# Altium footprint library Connector.PcbLib: 536 footprints (part 2 of 34)
Each footprint in its own frame and in the unit in brackets; x right, y up, seen from the top. Pads: shape width x height; smd on the part's side, far side on the other; paste and mask are expansions set on the pad; w line width, h text height; cw(c..) or ccw(c..) is an arc to the next point about the centre after c.
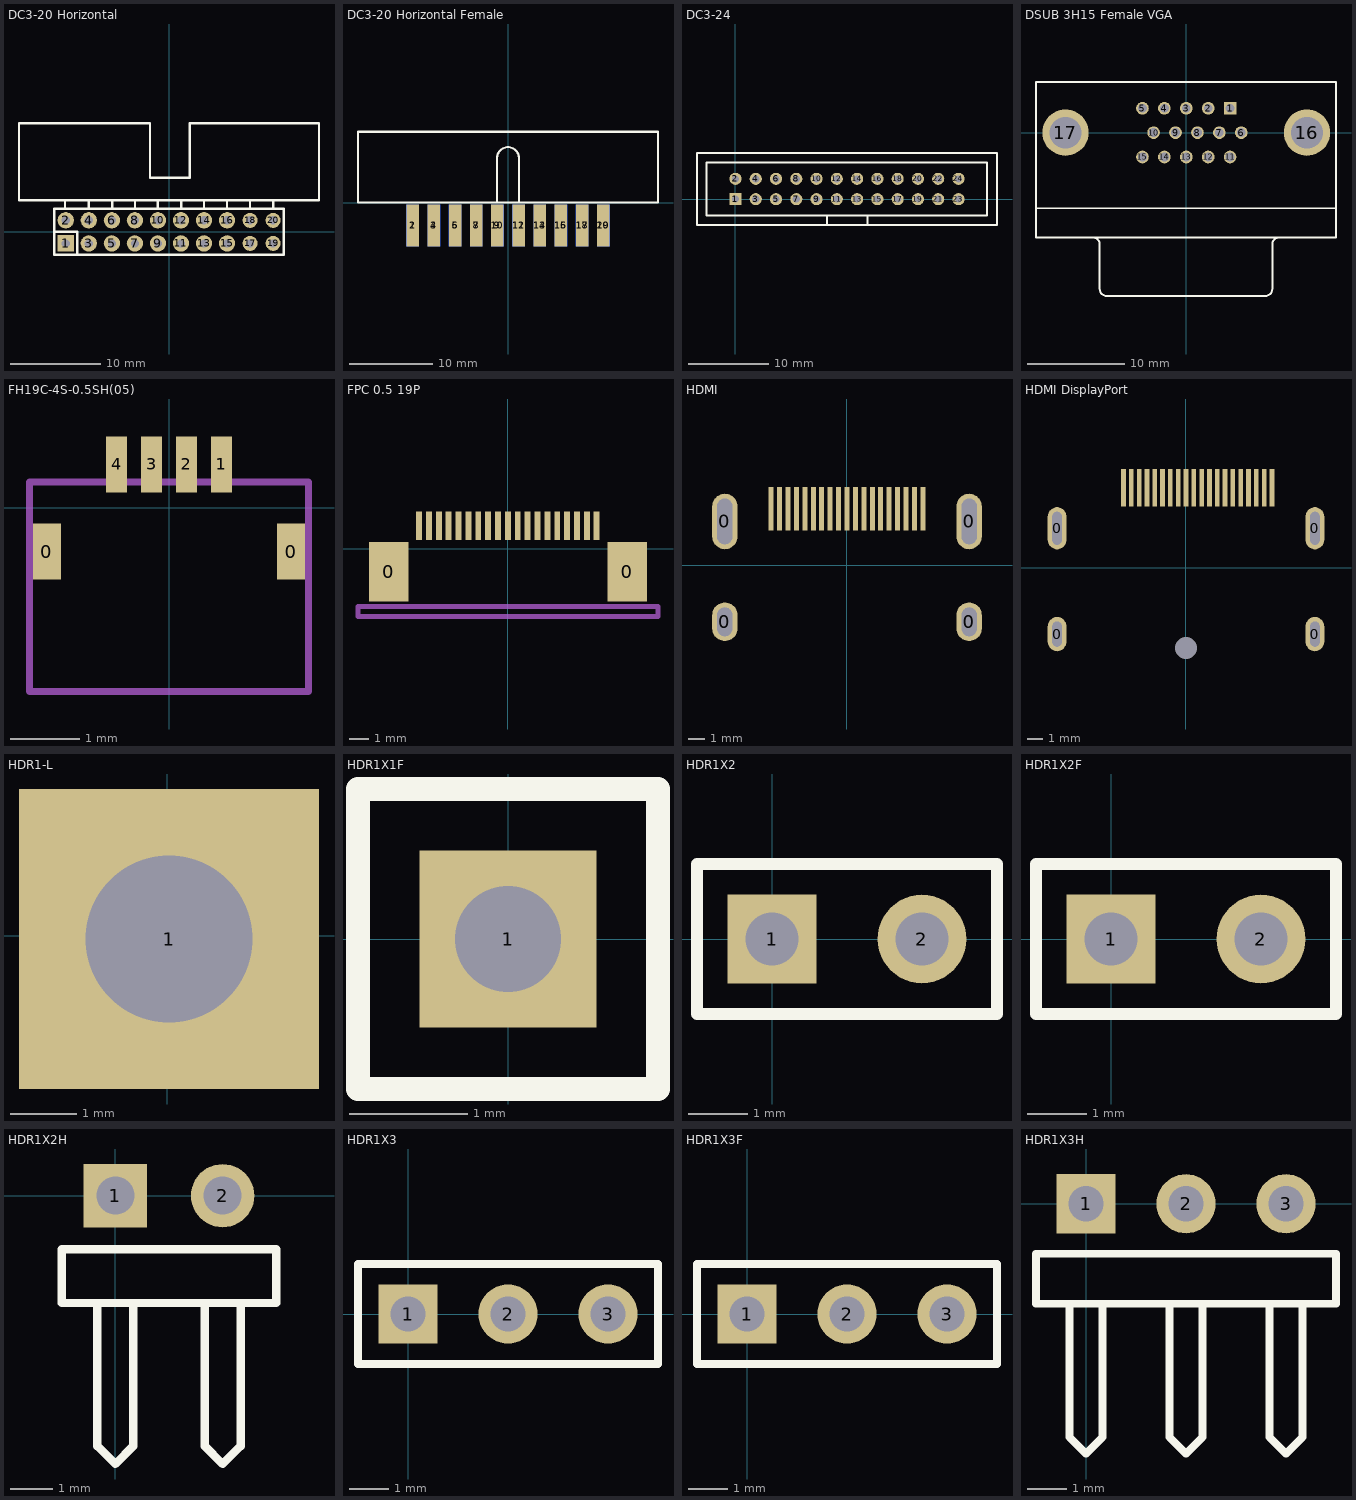
[diagram p1: the footprints below, top view; thin cyan lines are the x and y axes]

## DC3-20 Horizontal [mm]
pads (20):
  rect 1.8x1.8 hole 0.9: 1(-11.43,-1.27)
  round 1.8 hole 0.9: 2(-11.43,1.27) 3(-8.89,-1.27) 4(-8.89,1.27) 5(-6.35,-1.27) 6(-6.35,1.27) 7(-3.81,-1.27) 8(-3.81,1.27) 9(-1.27,-1.27) 10(-1.27,1.27) 11(1.27,-1.27) 12(1.27,1.27) 13(3.81,-1.27) 14(3.81,1.27) 15(6.35,-1.27) 16(6.35,1.27)
  round 1.651 hole 0.9: 17(8.89,-1.27) 18(8.89,1.27) 19(11.43,-1.27) 20(11.43,1.27)
Top Overlay:
  lines w0.25: -11.504,2.543 -11.504,3.483 ; -8.904,2.543 -8.904,3.483 ; -6.304,2.543 -6.304,3.483 ; -3.804,2.543 -3.804,3.483 ; -1.304,2.543 -1.304,3.483 ; 1.296,2.543 1.296,3.483 ; 3.796,2.543 3.796,3.483 ; 6.35,2.543 6.35,3.483 ; 8.89,2.543 8.89,3.483 ; 11.43,2.543 11.43,3.483 ; -16.586,3.483 16.485,3.483 16.485,11.983 2.235,11.983 2.235,5.963 -2.134,5.963 -2.134,11.983 -16.586,11.983 -16.586,3.483
  lines w0.254: -12.704,0.003 -10.164,0.003 -10.164,-2.537 ; -12.704,-2.537 -12.704,2.543 12.598,2.543 12.598,-2.537 -12.704,-2.537
3D body "612020235121.stp": height 9.1, standoff 0.05, extent -16.583,0.108 16.477,12.108

## DC3-20 Horizontal Female [mm]
pads (20):
  rect 1.5x5 smd: 1(-11.43,-2.746) 3(-8.89,-2.746) 5(-6.35,-2.746) 7(-3.81,-2.746) 9(-1.27,-2.746) 11(1.27,-2.746) 13(3.81,-2.746) 15(6.35,-2.746) 17(8.89,-2.746) 19(11.43,-2.746)
  rect 1.5x5 smd far side: 2(-11.43,-2.746) 4(-8.89,-2.746) 6(-6.35,-2.746) 8(-3.81,-2.746) 10(-1.27,-2.746) 12(1.27,-2.746) 14(3.81,-2.746) 16(6.35,-2.746) 18(8.89,-2.746) 20(11.43,-2.746)
Top Overlay:
  lines w0.203: 17.907,8.5 18,8.5
  lines w0.254: -1.3,0 -1.3,5.359 cw(c0,5.359) 1.3,5.359 1.3,0 ; -18,0 -18,8.5 18,8.5 18,0 -18,0

## DC3-24 [mil] "24脚简易牛角座"
pads (24):
  rect 60x60 hole 35.43: 1(0,0)
  round 60 hole 35.43: 2(0,100) 3(100,0) 4(100,100) 5(200,0) 6(200,100) 7(300,0) 8(300,100) 9(400,0) 10(400,100) 11(500,0) 12(500,100) 13(600,0) 14(600,100) 15(700,0) 16(700,100) 17(800,0) 18(800,100) 19(900,0) 20(900,100) 21(1000,0) 22(1000,100) 23(1100,0) 24(1100,100)
Top Overlay:
  lines w10: 450.39,-127.17 450.39,-79.92 ; 651.61,-127.17 651.61,-79.92 ; -189.76,-127.17 -189.76,227.16 1290,227.16 1290,-127.17 -189.76,-127.17 ; -142.52,-79.92 -142.52,179.92 1240,179.92 1240,-79.92 -142.52,-79.92
3D body "61202421621.stp": height 359.25, standoff -117.13, extent -201.78,-125.2 1299.8,233.06

## DSUB 3H15 Female VGA [mm]
pads (17):
  rect 1.3x1.3 hole 0.9: 1(4.508,2.5)
  round 1.3 hole 0.9: 2(2.258,2.5) 3(0.008,2.5) 4(-2.242,2.5) 5(-4.492,2.5) 6(5.653,0) 7(3.403,0) 8(1.153,0) 9(-1.097,0) 10(-3.347,0) 11(4.508,-2.5) 12(2.258,-2.5) 13(0.008,-2.5) 14(-2.242,-2.5) 15(-4.492,-2.5)
  round 4.76 hole 3.26: 16(12.395,0) 17(-12.395,0)
Top Overlay:
  lines w0.2: -15.422,-7.762 15.378,-7.762 ; -15.422,5.187 -15.422,-10.762 15.378,-10.762 15.378,1.638 ; -9.582,-10.767 cw(c-9.582,-11.462) -8.887,-11.462 -8.887,-16.062 ; -8.882,-16.067 ccw(c-8.187,-16.067) -8.187,-16.762 8.143,-16.762 ccw(c8.143,-16.067) 8.838,-16.067 ; 8.843,-16.062 8.843,-11.462 cw(c9.538,-11.462) 9.538,-10.767
  lines w0.203: -15.422,5.187 15.378,5.187 ; 15.378,1.638 15.378,5.174
3D body "DB15F-VGA.STEP": height 12.52, standoff -4.73, extent -15.411,-18.141 15.389,3.759

## FH19C-4S-0.5SH(05) [mm]
pads (6):
  rect 0.4x0.8 smd: 0(-1.75,-0.625) 0(1.75,-0.625)
  rect 0.3x0.8 smd: 1(0.75,0.625) 2(0.25,0.625) 3(-0.25,0.625) 4(-0.75,0.625)
Mechanical 15:
  lines w0.102: -2,-2.631 2,-2.631 2,0.375 -2,0.375 -2,-2.631
3D body "FH19C-4S-0.5SH.stp": height 0.95, standoff 0.05, extent -2,-2.631 2,0.869

## FPC 0.5 19P [mm]
pads (21):
  rect 2x3 smd: 0(-6.04,-1.162) 0(6.04,-1.162)
  rect 0.3x1.45 smd: 1(4.5,1.162) 2(4,1.162) 3(3.5,1.162) 4(3,1.162) 5(2.5,1.162) 6(2,1.162) 7(1.5,1.162) 8(1,1.162) 9(0.5,1.162) 10(0,1.162) 11(-0.5,1.162) 12(-1,1.162) 13(-1.5,1.162) 14(-2,1.162) 15(-2.5,1.162) 16(-3,1.162) 17(-3.5,1.162) 18(-4,1.162) 19(-4.5,1.162)
Mechanical 15:
  lines w0.254: -7.595,-3.435 -7.595,-2.927 7.605,-2.927 7.605,-3.435 -7.595,-3.435

## HDMI [mm]
pads (23):
  oval 1.5x2.3 hole 0.9 slot 1.7 at 90 deg: 0(-7.25,-3.352) 0(7.25,-3.352)
  oval 1.5x3.3 hole 0.9 slot 2.7 at 90 deg: 0(-7.25,2.598) 0(7.25,2.598)
  rect 0.3x2.6 smd: 1(4.5,3.352) 2(4,3.352) 3(3.5,3.352) 4(3,3.352) 5(2.5,3.352) 6(2,3.352) 7(1.5,3.352) 8(1,3.352) 9(0.5,3.352) 10(0,3.352) 11(-0.5,3.352) 12(-1,3.352) 13(-1.5,3.352) 14(-2,3.352) 15(-2.5,3.352) 16(-3,3.352) 17(-3.5,3.352) 18(-4,3.352) 19(-4.5,3.352)
3D body "471510001.stp": height 6.28, standoff -2.1, extent -7.5,-7.998 7.5,4.152

## HDMI DisplayPort [mm]
pads (25):
  oval 1.2x2.2 hole 0.6 slot 1.6 at 90 deg: 0(-8.25,-4.238) 0(8.25,-4.238)
  oval 1.2x2.7 hole 0.6 slot 2.1 at 90 deg: 0(-8.25,2.537) 0(8.25,2.537)
  rect 0.3x2.4 smd: 1(5.5,5.138) 2(5,5.138) 3(4.5,5.138) 4(4,5.138) 5(3.5,5.138) 6(3,5.138) 7(2.5,5.138) 8(2,5.138) 9(1.5,5.138) 10(1,5.138) 11(0.5,5.138) 12(0,5.138) 13(-0.5,5.138) 14(-1,5.138) 15(-1.5,5.138) 16(-2,5.138) 17(-2.5,5.138) 18(-3,5.138) 19(-3.5,5.138) 20(-4,5.138)
  round 0 hole 1.4: PAD(0,-5.137)
3D body "472720001.stp": height 6.65, standoff -2.1, extent -8.9,-9.457 8.885,5.433

## HDR1-L [mm]
pads (1):
  rect 4.5x4.5 hole 2.5: 1(0.025,-0.051)

## HDR1X1F [mm] "单排1针排针"
pads (1):
  rect 1.5x1.5 hole 0.9: 1(0,0)
Top Overlay:
  lines w0.2: -1.27,-1.27 -1.27,1.27 1.27,1.27 1.27,-1.27 -1.27,-1.27
3D body "HEADER_1X1.STEP": height 2.47, standoff -9.07, extent -1.245,-1.295 1.295,1.245

## HDR1X2 [mm] "Connector; Header; 2 Position"
pads (2):
  rect 1.5x1.5 hole 0.9: 1(0,0)
  round 1.5 hole 0.9: 2(2.54,0)
Top Overlay:
  lines w0.2: -1.27,-1.27 3.81,-1.27 3.81,1.27 -1.27,1.27 -1.27,-1.27
3D body "HDR1X2.STEP": height 4.25, standoff -3.12, extent -1.271,-1.27 3.809,1.27

## HDR1X2F [mm] "单排2针排针"
pads (2):
  rect 1.5x1.5 hole 0.9: 1(0,0)
  round 1.5 hole 0.9: 2(2.54,0)
Top Overlay:
  lines w0.2: -1.27,-1.27 -1.27,1.27 3.81,1.27 3.81,-1.27 -1.27,-1.27
3D body "1001-2.STEP": height 8.54, standoff -3, extent -1.25,-1.275 3.83,1.265

## HDR1X2H [mm] "Connector; Header; 2 Position; Right Angle"
pads (2):
  rect 1.5x1.5 hole 0.9: 1(0,0)
  round 1.5 hole 0.9: 2(2.54,0)
Top Overlay:
  lines w0.2: -0.423,-2.54 -0.423,-5.927 0,-6.35 0.423,-5.927 0.423,-2.54 ; 2.117,-2.54 2.117,-5.927 2.54,-6.35 2.963,-5.927 2.963,-2.54 ; -1.27,-2.54 -1.27,-1.27 3.81,-1.27 3.81,-2.54 -1.27,-2.54
3D body "HDR1X2H.STEP": height 2.54, standoff -3.2, extent -1.27,-5.609 3.81,0.203

## HDR1X3 [mm] "Connector; Header; 3 Position"
pads (3):
  rect 1.5x1.5 hole 0.9: 1(0,0)
  round 1.5 hole 0.9: 2(2.54,0) 3(5.08,0)
Top Overlay:
  lines w0.2: -1.27,-1.27 6.35,-1.27 6.35,1.27 -1.27,1.27 -1.27,-1.27
3D body "HDR1X3.STEP": height 4.25, standoff -3.12, extent -1.295,-1.346 6.325,1.194

## HDR1X3F [mm] "单排3针排针"
pads (3):
  rect 1.5x1.5 hole 0.9: 1(0,0)
  round 1.5 hole 0.9: 2(2.54,0) 3(5.08,0)
Top Overlay:
  lines w0.2: -1.27,-1.27 -1.27,1.27 6.35,1.27 6.35,-1.27 -1.27,-1.27
3D body "1001-3.STEP": height 8.54, standoff -3, extent -1.27,-1.27 6.35,1.27

## HDR1X3H [mm] "Connector; Header; 3 Position; Right Angle"
pads (3):
  rect 1.5x1.5 hole 0.9: 1(0,0)
  round 1.5 hole 0.9: 2(2.54,0) 3(5.08,0)
Top Overlay:
  lines w0.2: -0.423,-2.54 -0.423,-5.927 0,-6.35 0.423,-5.927 0.423,-2.54 ; 2.117,-2.54 2.117,-5.927 2.54,-6.35 2.963,-5.927 2.963,-2.54 ; 4.657,-2.54 4.657,-5.927 5.08,-6.35 5.503,-5.927 5.503,-2.54 ; -1.27,-2.54 -1.27,-1.27 6.35,-1.27 6.35,-2.54 -1.27,-2.54
3D body "HDR1X3H.STEP": height 2.58, standoff -3.16, extent -1.24,-5.537 6.38,0.275